# Altium integrated library Cap-Tant-SMD_V2.IntLib: 147 symbols
Pins are listed as number, name and electrical type; pins without a type are passive.

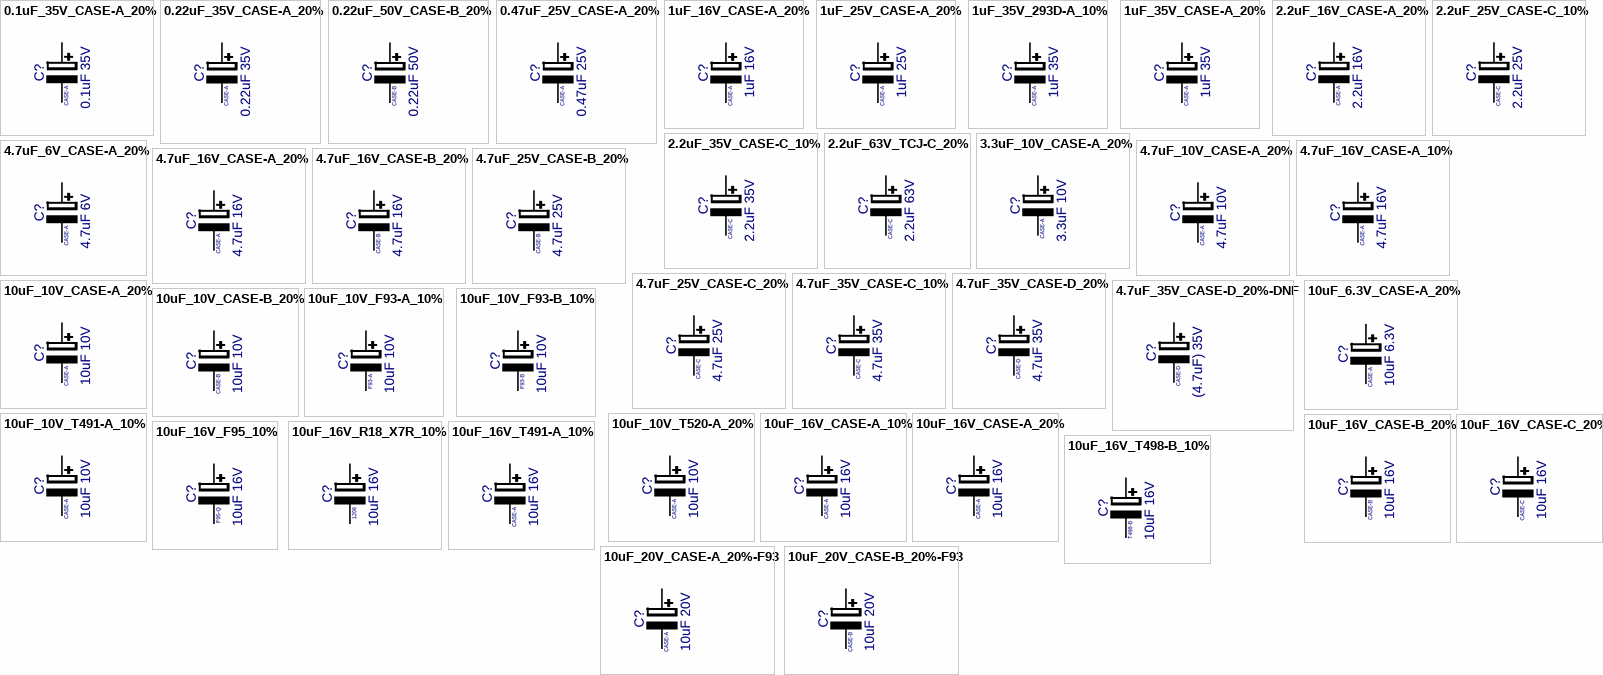
[diagram p0: symbols 0.1uF_35V_CASE-A_20% to 10uF_20V_CASE-B_20%-F93]

## 0.1uF_35V_CASE-A_20%
designator C?, comment value 0.1uF  Voltage: 35V  Text1: CASE-A  (hidden comment: 0.1uF_35V_T491A_20%)
Cap Tantalum Case-A; Manufacturer: Various; Tol: 20%; Reutech PN: 5910-TN-; Part Number: 0.1uF_35V_T491A_20%; Package: T491-A; EDM-PN: *; Text2: *; SAAB PN: *; DCE Part No: *
footprint T491-A (Tant Capacitor, 2-Leads, Body 3.2x1.6mm, IPC Medium Density)
pins: 1, 2

## 0.22uF_35V_CASE-A_20%
designator C?, comment value 0.22uF  Voltage: 35V  Text1: CASE-A  (hidden comment: 0.22uF_35V_T491A_20%)
Cap Tantalum Case-A; Manufacturer: Various; Tol: 20%; Reutech PN: 5910-TN-; Part Number: 0.22uF_35V_T491A_20%; Package: T491-A; EDM-PN: *; Text2: *; SAAB PN: *; DCE Part No: *
footprint T491-A (Tant Capacitor, 2-Leads, Body 3.2x1.6mm, IPC Medium Density)
pins: 1, 2

## 0.22uF_50V_CASE-B_20%
designator C?, comment value 0.22uF  Voltage: 50V  Text1: CASE-B  (hidden comment: 0.22uF_50V_T491B_20%)
Cap Tantalum Case-B; Manufacturer: Various; Part Number: 0.22uF_35V_T491B_20%; Tol: 20%; Reutech PN: 5910-TN-; Package: T491-B; EDM-PN: *; Text2: *; SAAB PN: *; DCE Part No: *
footprint T491-B (Tant Capacitor, 2-Leads, Body 3.5x2.8mm, IPC Medium Density)
pins: 1, 2

## 0.47uF_25V_CASE-A_20%
designator C?, comment value 0.47uF  Voltage: 25V  Text1: CASE-A  (hidden comment: 0.47uF_25V_T491A_20%)
Cap Tantalum Case-A; Manufacturer: Various; Tol: 20%; Reutech PN: 5910-TN-; Part Number: 0.47uF_25V_T491A_20%; Package: T491-A; EDM-PN: *; Text2: *; SAAB PN: *; DCE Part No: *
footprint T491-A (Tant Capacitor, 2-Leads, Body 3.2x1.6mm, IPC Medium Density)
pins: 1, 2

## 1uF_16V_CASE-A_20%
designator C?, comment value 1uF  Voltage: 16V  Text1: CASE-A  (hidden comment: 1uF_16V_T491A_20%)
Cap Tantalum Case-A; Manufacturer: Various; Tol: 20%; Reutech PN: 5910-TN-; Part Number: 1uF_16V_T491A_20%; Package: T491-A; EDM-PN: *; Text2: *; SAAB PN: *; DCE Part No: *
footprint T491-A (Tant Capacitor, 2-Leads, Body 3.2x1.6mm, IPC Medium Density)
pins: 1, 2

## 1uF_25V_CASE-A_20%
designator C?, comment value 1uF  Voltage: 25V  Text1: CASE-A  (hidden comment: 1uF_25V_T491A_20%)
Cap Tantalum Case-A; Manufacturer: Various; Tol: 20%; Reutech PN: 5910-TN-; Part Number: 1uF_25V_T491A_20%; Package: T491-A; EDM-PN: *; Text2: *; SAAB PN: *; DCE Part No: *
footprint T491-A (Tant Capacitor, 2-Leads, Body 3.2x1.6mm, IPC Medium Density)
pins: 1, 2

## 1uF_35V_293D-A_10%
designator C?  value 1uF  Voltage: 35V  Text1: CASE-A  (hidden comment: 1uF_35V_293D-A_10%)
Cap Tantalum Case-A - 293D; Manufacturer: Vishay; Part Number: 293D105X9035A2TE3; Tol: 10%; Reutech PN: 5910-TN-; Package: T491-A; EDM-PN: *; Text2: *; SAAB PN: *; DCE Part No: *
footprint T491-A (Tant Capacitor, 2-Leads, Body 3.2x1.6mm, IPC Medium Density)
pins: 1, 2

## 1uF_35V_CASE-A_20%
designator C?, comment value 1uF  Voltage: 35V  Text1: CASE-A  (hidden comment: 1uF_35V_T491A_20%)
Cap Tantalum Case-A; Manufacturer: Various; Tol: 20%; Reutech PN: 5910-TN-; Part Number: 1uF_35V_T491A_20%; Package: T491-A; EDM-PN: *; Text2: *; SAAB PN: *; DCE Part No: *
footprint T491-A (Tant Capacitor, 2-Leads, Body 3.2x1.6mm, IPC Medium Density)
pins: 1, 2

## 2.2uF_16V_CASE-A_20%
designator C?, comment value 2.2uF  Voltage: 16V  Text1: CASE-A  (hidden comment: 2.2uF_16V_T491A_20%)
Cap Tantalum Case-A; Manufacturer: Various; Tol: 20%; Reutech PN: 5910-TN-; Part Number: 2.2uF_16V_T491A_20%; Package: T491-A; EDM-PN: *; Text2: *; SAAB PN: *; DCE Part No: *
footprint T491-A (Tant Capacitor, 2-Leads, Body 3.2x1.6mm, IPC Medium Density)
pins: 1, 2

## 2.2uF_25V_CASE-C_10%
designator C?, comment value 2.2uF  Voltage: 25V  Text1: CASE-C  (hidden comment: 2.2uF_25V_T491C_10%)
Cap Tantalum Case-C; Manufacturer: Various; Tol: 10%; Reutech PN: 5910-TN-; Part Number: 2.2uF_25V_T491C_10%; Package: T491-C; EDM-PN: *; Text2: *; SAAB PN: *; DCE Part No: *
footprint T491-C (Tant Capacitor, 2-Leads, Body 6.0x3.2mm, IPC Medium Density)
pins: 1, 2

## 2.2uF_35V_CASE-C_10%
designator C?, comment value 2.2uF  Voltage: 35V  Text1: CASE-C  (hidden comment: 2.2uF_35V_T491C_10%)
Cap Tantalum Case-C; Manufacturer: Various; Tol: 10%; Reutech PN: 5910-TN-; Part Number: 2.2uF_35V_T491C_10%; Package: T491-C; EDM-PN: *; Text2: *; SAAB PN: *; DCE Part No: *
footprint T491-C (Tant Capacitor, 2-Leads, Body 6.0x3.2mm, IPC Medium Density)
pins: 1, 2

## 2.2uF_63V_TCJ-C_20%
designator C?, comment value 2.2uF  Voltage: 63V  Text1: CASE-C  (hidden comment: TCJC225M063R0200)
Cap Tantalum-Polymer Case-C; Manufacturer: AVX; Tol: 20%; Reutech PN: 5910-TN-; Part Number: TCJC225M063R0200; Package: T491-C; EDM-PN: *; Text2: *; SAAB PN: *; DCE Part No: *
footprint T491-C (Tant Capacitor, 2-Leads, Body 6.0x3.2mm, IPC Medium Density)
pins: 1, 2

## 3.3uF_10V_CASE-A_20%
designator C?, comment value 3.3uF  Voltage: 10V  Text1: CASE-A  (hidden comment: 3.3uF_10V_T491A_20%)
Cap Tantalum Case-A; Manufacturer: Various; Tol: 20%; Reutech PN: 5910-TN-; Part Number: 3.3uF_10V_T491A_20%; Package: T491-A; EDM-PN: *; Text2: *; SAAB PN: *; DCE Part No: *
footprint T491-A (Tant Capacitor, 2-Leads, Body 3.2x1.6mm, IPC Medium Density)
pins: 1, 2

## 4.7uF_6V_CASE-A_20%
designator C?, comment value 4.7uF  Voltage: 6V  Text1: CASE-A  (hidden comment: 4.7uF_6V_T491A_20%)
Cap Tantalum Case-A; Manufacturer: Various; Tol: 20%; Reutech PN: 5910-TN-; Part Number: 4.7uF_6V_T491A_20%; Package: T491-A; EDM-PN: *; Text2: *; SAAB PN: *; DCE Part No: *
footprint T491-A (Tant Capacitor, 2-Leads, Body 3.2x1.6mm, IPC Medium Density)
pins: 1, 2

## 4.7uF_10V_CASE-A_20%
designator C?, comment value 4.7uF  Voltage: 10V  Text1: CASE-A  (hidden comment: 4.7uF_10V_T491A_20%)
Cap Tantalum Case-A; Manufacturer: Various; Tol: 20%; Reutech PN: 5910-TN-; Part Number: 4.7uF_10V_T491A_20%; Package: T491-A; EDM-PN: *; Text2: *; SAAB PN: *; DCE Part No: *
footprint T491-A (Tant Capacitor, 2-Leads, Body 3.2x1.6mm, IPC Medium Density)
pins: 1, 2

## 4.7uF_16V_CASE-A_10%
designator C?, comment value 4.7uF  Voltage: 16V  Text1: CASE-A  (hidden comment: 4.7uF_16V_T491A_10%)
Cap Tantalum Case-A; Manufacturer: Various; EDM-PN: CAP36; Tol: 10%; Reutech PN: 5910-TN-; Part Number: 4.7uF_16V_T491A_10%; Package: T491-A; Text2: *; SAAB PN: *; DCE Part No: *
footprint T491-A (Tant Capacitor, 2-Leads, Body 3.2x1.6mm, IPC Medium Density)
pins: 1, 2

## 4.7uF_16V_CASE-A_20%
designator C?, comment value 4.7uF  Voltage: 16V  Text1: CASE-A  (hidden comment: 4.7uF_16V_T491A_20%)
Cap Tantalum Case-A; Manufacturer: Various; EDM-PN: CAP36; Tol: 20%; Reutech PN: 5910-TN-; Part Number: 4.7uF_16V_T491A_20%; Package: T491-A; Text2: *; SAAB PN: *; DCE Part No: *
footprint T491-A (Tant Capacitor, 2-Leads, Body 3.2x1.6mm, IPC Medium Density)
pins: 1, 2

## 4.7uF_16V_CASE-B_20%
designator C?, comment value 4.7uF  Voltage: 16V  Text1: CASE-B  (hidden comment: 4.7uF_16V_T491B_20%)
Cap Tantalum Case-B; Manufacturer: Various; Tol: 20%; Reutech PN: 5910-TN-; Part Number: 4.7uF_16V_T491B_20%; Package: T491-B; EDM-PN: *; Text2: *; SAAB PN: *; DCE Part No: *
footprint T491-B (Tant Capacitor, 2-Leads, Body 3.5x2.8mm, IPC Medium Density)
pins: 1, 2

## 4.7uF_25V_CASE-B_20%
designator C?, comment value 4.7uF  Voltage: 25V  Text1: CASE-B  (hidden comment: 4.7uF_25V_T491B_20%)
Cap Tantalum Case-B; Manufacturer: Various; Tol: 20%; Reutech PN: 5910-TN-; Part Number: 4.7uF_25V_T491B_20%; Package: T491-B; EDM-PN: *; Text2: *; SAAB PN: *; DCE Part No: *
footprint T491-B (Tant Capacitor, 2-Leads, Body 3.5x2.8mm, IPC Medium Density)
pins: 1, 2

## 4.7uF_25V_CASE-C_20%
designator C?, comment value 4.7uF  Voltage: 25V  Text1: CASE-C  (hidden comment: 4.7uF_25V_T491C_20%)
Cap Tantalum Case-C; Manufacturer: Various; Tol: 20%; Reutech PN: 5910-TN-; Part Number: 4.7uF_25V_T491C_20%; Package: T491-C; EDM-PN: *; Text2: *; SAAB PN: *; DCE Part No: *
footprint T491-C (Tant Capacitor, 2-Leads, Body 6.0x3.2mm, IPC Medium Density)
pins: 1, 2

## 4.7uF_35V_CASE-C_10%
designator C?, comment value 4.7uF  Voltage: 35V  Text1: CASE-C  (hidden comment: 4.7uF_35V_T491C_10%)
Cap Tantalum Case-C; Manufacturer: Various; EDM-PN: CAP37; Tol: 10%; Reutech PN: 5910-TN-; Part Number: 4.7uF_35V_T491C_10%; Package: T491-C; Text2: *; SAAB PN: *; DCE Part No: *
footprint T491-C (Tant Capacitor, 2-Leads, Body 6.0x3.2mm, IPC Medium Density)
pins: 1, 2

## 4.7uF_35V_CASE-D_20%
designator C?, comment value 4.7uF  Voltage: 35V  Text1: CASE-D  (hidden comment: 4.7uF_35V_T491D_20%)
Cap Tantalum Case-D; Manufacturer: Various; Tol: 20%; Reutech PN: 5910-TN-; Part Number: 4.7uF_35V_T491D_20%; Package: T491-D; EDM-PN: *; Text2: *; SAAB PN: *; DCE Part No: *
footprint T491-D (Tant Capacitor, 2-Leads, Body 7.3x4.3mm, IPC Medium Density)
pins: 1, 2

## 4.7uF_35V_CASE-D_20%-DNF
designator C?, comment value (4.7uF)  Voltage: 35V  Text1: CASE-D  (hidden comment: 4.7uF_35V_T491D_20%)
Cap Tantalum Case-D - Do not Fit; Manufacturer: Various; Part Number: DNF - 4.7uF_35V_T491D_20%; Tol: 20%; Reutech PN: 5910-TN-; Package: T491-D; EDM-PN: *; Text2: *; SAAB PN: *; DCE Part No: *
footprint T491-D (Tant Capacitor, 2-Leads, Body 7.3x4.3mm, IPC Medium Density)
pins: 1, 2

## 10uF_6.3V_CASE-A_20%
designator C?, comment value 10uF  Voltage: 6.3V  Text1: CASE-A  (hidden comment: 10uF_6.3V_T491A_20%)
Cap Tantalum Case-A; Manufacturer: Various; Tol: 20%; Reutech PN: 5910-TN-; Part Number: 10uF_6.3V_T491A_20%; Package: T491-A; EDM-PN: *; Text2: *; SAAB PN: *; DCE Part No: *
footprint T491-A (Tant Capacitor, 2-Leads, Body 3.2x1.6mm, IPC Medium Density)
pins: 1, 2

## 10uF_10V_CASE-A_20%
designator C?, comment value 10uF  Voltage: 10V  Text1: CASE-A  (hidden comment: 10uF_10V_T491A_20%)
Cap Tantalum Case-A; Manufacturer: Various; EDM-PN: CAP541; Tol: 20%; Reutech PN: 5910-TN-; Part Number: 10uF_10V_T491A_20%; Package: T491-A; Text2: *; SAAB PN: *; DCE Part No: *
footprint T491-A (Tant Capacitor, 2-Leads, Body 3.2x1.6mm, IPC Medium Density)
pins: 1, 2

## 10uF_10V_CASE-B_20%
designator C?, comment value 10uF  Voltage: 10V  Text1: CASE-B  (hidden comment: 10uF_10V_T491B_20%)
Cap Tantalum Case-B; Manufacturer: Various; Tol: 20%; Reutech PN: 5910-TN-; Part Number: 10uF_10V_T491B_20%; Package: T491-B; EDM-PN: *; Text2: *; SAAB PN: *; DCE Part No: *
footprint T491-B (Tant Capacitor, 2-Leads, Body 3.5x2.8mm, IPC Medium Density)
pins: 1, 2

## 10uF_10V_F93-A_10%
designator C?  value 10uF  Voltage: 10V  Text1: F93-A  (hidden comment: 10uF_10V_F93-A_10%)
Cap Tantalum Case-A; Manufacturer: AVX; Part Number: F931D106MAA; Tol: 10%; Reutech PN: 5910-TN-; Package: Tant-F93-A; EDM-PN: *; Text2: *; SAAB PN: *; DCE Part No: *
footprint Tant-F93-A (Tant Capacitor, 2-Leads, Body 3.2x1.6mm, IPC Medium Density)
pins: 1, 2

## 10uF_10V_F93-B_10%
designator C?  value 10uF  Voltage: 10V  Text1: F93-B  (hidden comment: 10uF_10V_F93-B_10%)
Cap Tantalum Case-B; Manufacturer: AVX; Part Number: F931D106MBA; Tol: 10%; Reutech PN: 5910-TN-; Package: Tant-F93-B; EDM-PN: *; Text2: *; SAAB PN: *; DCE Part No: *
footprint Tant-F93-B (Tant Capacitor, 2-Leads, Body 3.5x2.8mm, IPC Medium Density)
pins: 1, 2

## 10uF_10V_T491-A_10%
designator C?, comment value 10uF  Voltage: 10V  Text1: CASE-A  (hidden comment: T491A106K010AT)
Cap Tantalum Case-A; Manufacturer: Kemet; Tol: 10%; Reutech PN: 5910-TN-; Part Number: T491A106K010AT; Package: T491-A; EDM-PN: *; Text2: *; SAAB PN: *; DCE Part No: *
footprint T491-A (Tant Capacitor, 2-Leads, Body 3.2x1.6mm, IPC Medium Density)
pins: 1, 2

## 10uF_10V_T520-A_20%
designator C?, comment value 10uF  Voltage: 10V  Text1: CASE-A  (hidden comment: 10uF_10V_T520A_20%)
Cap Tantalum Case-A Low ESR; Manufacturer: Kemet; Part Number: T520A106M010ATE080; Tol: 20%; Reutech PN: 5910-TN-0186; Package: T491-A; EDM-PN: *; Text2: *; SAAB PN: *; DCE Part No: *
footprint T491-A (Tant Capacitor, 2-Leads, Body 3.2x1.6mm, IPC Medium Density)
pins: 1, 2

## 10uF_16V_CASE-A_10%
designator C?, comment value 10uF  Voltage: 16V  Text1: CASE-A  (hidden comment: 10uF_16V_T491A_10%)
Cap Tantalum Case-A; Manufacturer: Various; EDM-PN: CAP213; Tol: 10%; Reutech PN: 5910-TN-; SAAB PN: 1AAC00100AEA; Part Number: 10uF_16V_T491A_10%; Package: T491-A; Text2: *; DCE Part No: *
footprint T491-A (Tant Capacitor, 2-Leads, Body 3.2x1.6mm, IPC Medium Density)
pins: 1, 2

## 10uF_16V_CASE-A_20%
designator C?, comment value 10uF  Voltage: 16V  Text1: CASE-A  (hidden comment: 10uF_16V_T491A_20%)
Cap Tantalum Case-A; Manufacturer: Various; Tol: 20%; Reutech PN: 5910-TN-; Part Number: 10uF_16V_T491A_20%; Package: T491-A; EDM-PN: *; Text2: *; SAAB PN: *; DCE Part No: *
footprint T491-A (Tant Capacitor, 2-Leads, Body 3.2x1.6mm, IPC Medium Density)
pins: 1, 2

## 10uF_16V_CASE-B_20%
designator C?, comment value 10uF  Voltage: 16V  Text1: CASE-B  (hidden comment: 10uF_16V_T491B_20%)
Cap Tantalum Case-B; Manufacturer: Various; Tol: 20%; Reutech PN: 5910-TN-; Part Number: 10uF_16V_T491B_20%; Package: T491-B; EDM-PN: *; Text2: *; SAAB PN: *; DCE Part No: *
footprint T491-B (Tant Capacitor, 2-Leads, Body 3.5x2.8mm, IPC Medium Density)
pins: 1, 2

## 10uF_16V_CASE-C_20%
designator C?, comment value 10uF  Voltage: 16V  Text1: CASE-C  (hidden comment: 10uF_16V_T491C_20%)
Cap Tantalum Case-C; Manufacturer: Various; Tol: 20%; Reutech PN: 5910-TN-0085; Part Number: 10uF_16V_T491C_20%; Package: T491-C; EDM-PN: *; Text2: *; SAAB PN: *; DCE Part No: *
footprint T491-C (Tant Capacitor, 2-Leads, Body 6.0x3.2mm, IPC Medium Density)
pins: 1, 2

## 10uF_16V_F95_10%
designator C?, comment value 10uF  Voltage: 16V  Text1: F95-Q  (hidden comment: F951C106KQAAQ2)
Cap Tantalum Case F95-Q; Manufacturer: AVX; Tol: 10%; Reutech PN: 5910-TN-; Part Number: F951C106KQAAQ2; Package: F95-Q; EDM-PN: *; Text2: *; SAAB PN: *; DCE Part No: *
footprint F95-Q (F95-Q 3.2x1.6mm)
pins: 1, 2

## 10uF_16V_R18_X7R_10%
designator C?  value 10uF  Voltage: 16V  Text1: 1206  (hidden comment: 10uF_16V_R18_X7R_10%)
Cap TanCeram Chip; Manufacturer: Johansondielectrics; Part Number: 160R18X106KV4E; Tol: 10%; Reutech PN: 5910-TN-; Package: CAPC1206X178N; EDM-PN: *; Text2: *; SAAB PN: *; DCE Part No: *
footprint CAPC1206X178N (Chip Capacitor, 1206, 2-Leads, Body 3.2x1.6mm, IPC Medium Density)
pins: 1, 2

## 10uF_16V_T491-A_10%
designator C?, comment value 10uF  Voltage: 16V  Text1: CASE-A  (hidden comment: T491A106K010AT)
Cap Tantalum Case-A; Manufacturer: Kemet; EDM-PN: CAP213; Tol: 10%; Reutech PN: 5910-TN-; Part Number: T491A106K010AT; Package: T491-A; Text2: *; SAAB PN: *; DCE Part No: *
footprint T491-A (Tant Capacitor, 2-Leads, Body 3.2x1.6mm, IPC Medium Density)
pins: 1, 2

## 10uF_16V_T498-B_10%
designator C?, comment value 10uF  Voltage: 16V  Text1: T498-B  (hidden comment: 10uF_16V_T498B_10%)
Cap Tantalum Case-B (-55 +150Deg); Manufacturer: Kemet; Part Number: T498B106K016ATE2K8; Tol: 10%; Reutech PN: 5910-TN-; Package: T491-B; EDM-PN: *; Text2: *; SAAB PN: *; DCE Part No: *
footprint T491-B (Tant Capacitor, 2-Leads, Body 3.5x2.8mm, IPC Medium Density)
pins: 1, 2

## 10uF_20V_CASE-A_20%-F93
designator C?, comment value 10uF  Text1: CASE-A  Voltage: 20V  (hidden comment: 10uF_20V_T491A_20%-F93)
Cap Tantalum Case-A; Manufacturer: AVX; Part Number: F931D106KAA; Tol: 20%; Reutech PN: 5910-TN-; Package: T491-A; EDM-PN: *; Text2: *; SAAB PN: *; DCE Part No: *
footprint T491-A (Tant Capacitor, 2-Leads, Body 3.2x1.6mm, IPC Medium Density)
pins: 1, 2

## 10uF_20V_CASE-B_20%-F93
designator C?, comment value 10uF  Voltage: 20V  Text1: CASE-B  (hidden comment: 10uF_20V_T491B_20%)
Cap Tantalum Case-B; Manufacturer: Various; Part Number: F931D106KBA; Tol: 20%; Reutech PN: 5910-TN-; Package: T491-B; EDM-PN: *; Text2: *; SAAB PN: *; DCE Part No: *
footprint T491-B (Tant Capacitor, 2-Leads, Body 3.5x2.8mm, IPC Medium Density)
pins: 1, 2

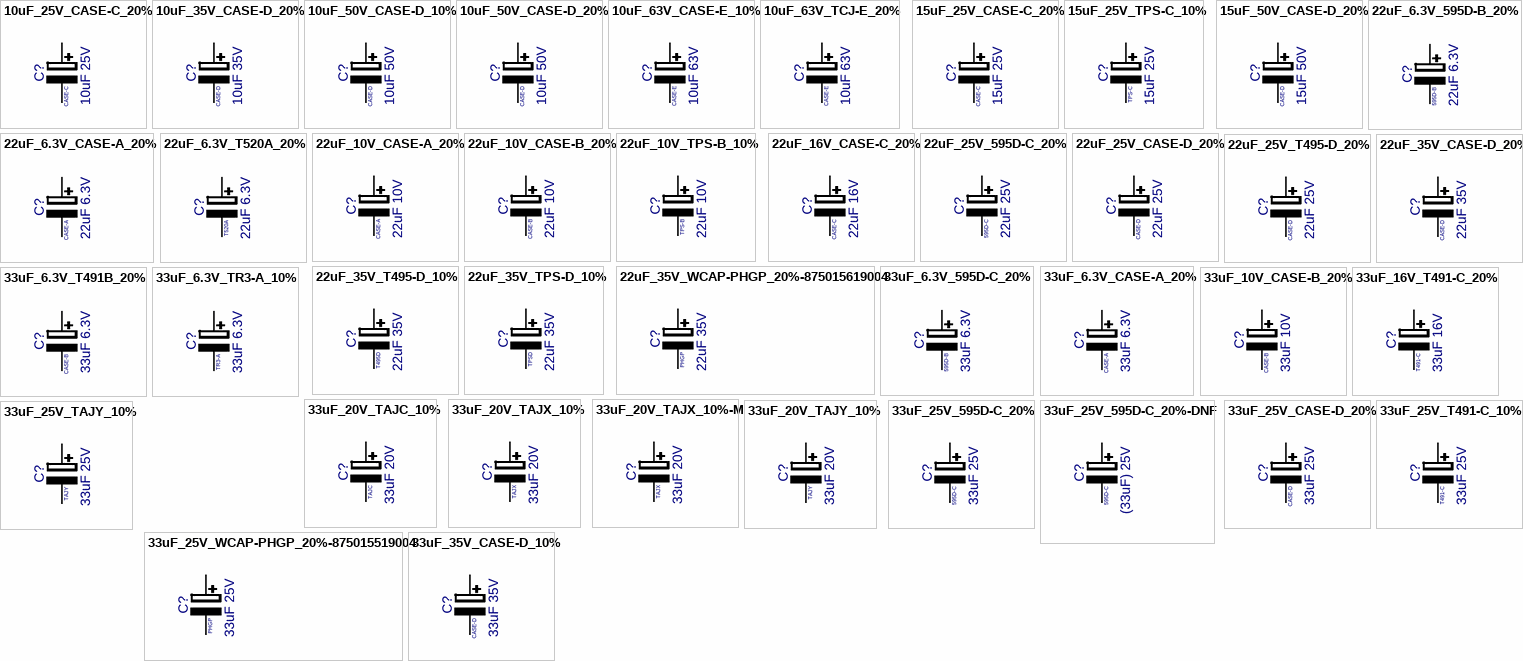
[diagram p1: symbols 10uF_25V_CASE-C_20% to 33uF_35V_CASE-D_10%]

## 10uF_25V_CASE-C_20%
designator C?, comment value 10uF  Voltage: 25V  Text1: CASE-C  (hidden comment: 10uF_25V_T491C_20%)
Cap Tantalum Case-C; Manufacturer: Various; Tol: 20%; Reutech PN: 5910-TN-; Part Number: 10uF_25V_T491C_20%; Package: T491-C; EDM-PN: *; Text2: *; SAAB PN: *; DCE Part No: *
footprint T491-C (Tant Capacitor, 2-Leads, Body 6.0x3.2mm, IPC Medium Density)
pins: 1, 2

## 10uF_35V_CASE-D_20%
designator C?, comment value 10uF  Voltage: 35V  Text1: CASE-D  (hidden comment: 10uF_35V_T491D_20%)
Cap Tantalum Case-D; Manufacturer: Various; Tol: 20%; Reutech PN: 5910-TN-; Part Number: 10uF_35V_T491D_20%; Package: T491-D; EDM-PN: *; Text2: *; SAAB PN: *; DCE Part No: *
footprint T491-D (Tant Capacitor, 2-Leads, Body 7.3x4.3mm, IPC Medium Density)
pins: 1, 2

## 10uF_50V_CASE-D_10%
designator C?, comment value 10uF  Voltage: 50V  Text1: CASE-D  (hidden comment: 10uF_50V_T491D_10%)
Cap Tantalum Case-D; Manufacturer: Various; Tol: 10%; Reutech PN: 5910-TN-; Part Number: 10uF_50V_T491D_10%; Package: T491-D; EDM-PN: *; Text2: *; SAAB PN: *; DCE Part No: *
footprint T491-D (Tant Capacitor, 2-Leads, Body 7.3x4.3mm, IPC Medium Density)
pins: 1, 2

## 10uF_50V_CASE-D_20%
designator C?, comment value 10uF  Voltage: 50V  Text1: CASE-D  (hidden comment: 10uF_50V_T491D_20%)
Cap Tantalum Case-D; Manufacturer: Various; Tol: 20%; Reutech PN: 5910-TN-; Part Number: 10uF_50V_T491D_20%; Package: T491-D; EDM-PN: *; Text2: *; SAAB PN: *; DCE Part No: *
footprint T491-D (Tant Capacitor, 2-Leads, Body 7.3x4.3mm, IPC Medium Density)
pins: 1, 2

## 10uF_63V_CASE-E_10%
designator C?, comment value 10uF  Voltage: 63V  Text1: CASE-E  (hidden comment: 293D106X9063E2TE3)
Cap Tantalum Type 293D Case-E; Manufacturer: Vishay; Tol: 10%; Reutech PN: 5910-TN-; Part Number: 293D106X9063E2TE3; Package: T491-E; EDM-PN: *; Text2: *; SAAB PN: *; DCE Part No: *
footprint T491-E (Tant Capacitor, 2-Leads, Body 7.3x6.0mm, IPC Medium Density)
pins: 1, 2

## 10uF_63V_TCJ-E_20%
designator C?, comment value 10uF  Voltage: 63V  Text1: CASE-E  (hidden comment: TCJE106M063R0100)
Cap Tantalum-Polymer Case-E; Manufacturer: AVX; Tol: 20%; Reutech PN: 5910-TN-; Part Number: TCJE106M063R0100; Package: T491-E; EDM-PN: *; Text2: *; SAAB PN: *; DCE Part No: *
footprint T491-E (Tant Capacitor, 2-Leads, Body 7.3x6.0mm, IPC Medium Density)
pins: 1, 2

## 15uF_25V_CASE-C_20%
designator C?, comment value 15uF  Voltage: 25V  Text1: CASE-C  (hidden comment: 15uF_25V_T491C_20%)
Cap Tantalum Case-C; Manufacturer: Various; Tol: 20%; Reutech PN: 5910-TN-; Part Number: 15uF_25V_T491C_20%; Package: T491-C; EDM-PN: *; Text2: *; SAAB PN: *; DCE Part No: *
footprint T491-C (Tant Capacitor, 2-Leads, Body 6.0x3.2mm, IPC Medium Density)
pins: 1, 2

## 15uF_25V_TPS-C_10%
designator C?  value 15uF  Voltage: 25V  Text1: TPS-C  (hidden comment: 15uF_25V_TPS-C_10%)
Cap Tantalum Case-C Low ESR; Manufacturer: AVX; Part Number: TPSC156K025R0220; EDM-PN: CAP1003; Tol: 10%; Reutech PN: 5910-TN-; SAAB PN: 1AAC00102AEA; Package: TPS-C; Text2: *; DCE Part No: *
footprint TPS-C (Tant Capacitor, 2-Leads, Body 6.0x3.2mm, IPC Medium Density)
pins: 1, 2

## 15uF_50V_CASE-D_20%
designator C?, comment value 15uF  Voltage: 50V  Text1: CASE-D  (hidden comment: 15uF_50V_Case-D_20%)
Cap Tantalum Case-D; Manufacturer: Various; Tol: 20%; Reutech PN: 5910-TN-; Part Number: 15uF_50V_Case-D_20%; Package: T491-D; EDM-PN: *; Text2: *; SAAB PN: *; DCE Part No: *
footprint T491-D (Tant Capacitor, 2-Leads, Body 7.3x4.3mm, IPC Medium Density)
pins: 1, 2

## 22uF_6.3V_595D-B_20%
designator C?  value 22uF  Voltage: 6.3V  Text1: 595D-B  (hidden comment: 22uF_6.3V_595D-B_20%)
Cap Tantalum Case-B; Manufacturer: Vishay; Part Number: 595D226X06R3B2T; Tol: 20%; Reutech PN: 5910-TN-; Package: T595D-B; EDM-PN: *; Text2: *; SAAB PN: *; DCE Part No: *
footprint T595D-B (Tant Capacitor, 2-Leads, Body 3.5x2.8mm, IPC Medium Density)
pins: 1, 2

## 22uF_6.3V_CASE-A_20%
designator C?, comment value 22uF  Voltage: 6.3V  Text1: CASE-A  (hidden comment: 22uF_6.3V_T491A_20%)
Cap Tantalum Case-A; Manufacturer: Various; Tol: 20%; Reutech PN: 5910-TN-; Part Number: 22uF_6.3V_T491A_20%; Package: T491-A; EDM-PN: *; Text2: *; SAAB PN: *; DCE Part No: *
footprint T491-A (Tant Capacitor, 2-Leads, Body 3.2x1.6mm, IPC Medium Density)
pins: 1, 2

## 22uF_6.3V_T520A_20%
designator C?  value 22uF  Voltage: 6.3V  Text1: T520A  (hidden comment: 22uF_6.3V_T520A_20%)
Cap Tantalum Case-A Low ESR; Manufacturer: Kemet; Part Number: T520A226M006ATE100; Tol: 20%; Reutech PN: 5910-TN-; Package: T491-A; EDM-PN: *; Text2: *; SAAB PN: *; DCE Part No: *
footprint T491-A (Tant Capacitor, 2-Leads, Body 3.2x1.6mm, IPC Medium Density)
pins: 1, 2

## 22uF_10V_CASE-A_20%
designator C?, comment value 22uF  Voltage: 10V  Text1: CASE-A  (hidden comment: 22uF_10V_T491A_20%)
Cap Tantalum Case-A; Manufacturer: Various; Tol: 20%; Reutech PN: 5910-TN-; Part Number: 22uF_10V_T491A_20%; Package: T491-A; EDM-PN: *; Text2: *; SAAB PN: *; DCE Part No: *
footprint T491-A (Tant Capacitor, 2-Leads, Body 3.2x1.6mm, IPC Medium Density)
pins: 1, 2

## 22uF_10V_CASE-B_20%
designator C?, comment value 22uF  Voltage: 10V  Text1: CASE-B  (hidden comment: 22uF_10V_T491B_20%)
Cap Tantalum Case-B; Manufacturer: Various; Tol: 20%; Reutech PN: 5910-TN-; Part Number: 22uF_10V_T491B_20%; Package: T491-C; EDM-PN: *; Text2: *; SAAB PN: *; DCE Part No: *
footprint T491-B (Tant Capacitor, 2-Leads, Body 3.5x2.8mm, IPC Medium Density)
pins: 1, 2

## 22uF_10V_TPS-B_10%
designator C?, comment value 22uF  Voltage: 10V  Text1: TPS-B  (hidden comment: 22uF_10V_TPS_B_10%)
Cap Tantalum Case-B Low ESR; Manufacturer: AVX; Part Number: TPSB226K010R0700; EDM-PN: CAP1004; Tol: 10%; Reutech PN: 5910-TN-; SAAB PN: 1AAC00108AEA; Package: TPS-B; Text2: *; DCE Part No: *
footprint T491-B (Tant Capacitor, 2-Leads, Body 3.5x2.8mm, IPC Medium Density)
pins: 1, 2

## 22uF_16V_CASE-C_20%
designator C?, comment value 22uF  Voltage: 16V  Text1: CASE-C  (hidden comment: 22uF_16V_T491C_20%)
Cap Tantalum Case-C; Manufacturer: Various; DCE Part No: 8441; Tol: 20%; Reutech PN: 5910-TN-; Part Number: 22uF_16V_T491C_20%; Package: T491-C; EDM-PN: *; Text2: *; SAAB PN: *
footprint T491-C (Tant Capacitor, 2-Leads, Body 6.0x3.2mm, IPC Medium Density)
pins: 1, 2

## 22uF_25V_595D-C_20%
designator C?  value 22uF  Voltage: 25V  Text1: 595D-C  (hidden comment: 22uF_25V_595D-C_20%)
Cap Tantalum Case-C; Manufacturer: Vishay; Part Number: 595D226X0025C2T; Tol: 20%; Reutech PN: 5910-TN-; Package: T595D-C; EDM-PN: *; Text2: *; SAAB PN: *; DCE Part No: *
footprint T595D-C (Tant Capacitor, 2-Leads, Body 6.0x3.2mm, IPC Medium Density)
pins: 1, 2

## 22uF_25V_CASE-D_20%
designator C?, comment value 22uF  Voltage: 25V  Text1: CASE-D  (hidden comment: 22uF_25V_T491D_20%)
Cap Tantalum Case-D; Manufacturer: Various; Tol: 20%; Reutech PN: 5910-TN-; Part Number: 22uF_25V_T491D_20%; Package: T491-D; EDM-PN: *; Text2: *; SAAB PN: *; DCE Part No: *
footprint T491-D (Tant Capacitor, 2-Leads, Body 7.3x4.3mm, IPC Medium Density)
pins: 1, 2

## 22uF_25V_T495-D_20%
designator C?  value 22uF  Voltage: 25V  Text1: CASE-D  (hidden comment: 22uF_25V_T495-D_20%)
Cap Tantalum T495 Low ESR; Manufacturer: Kemet; Part Number: T495D226M025ATE200; Tol: 20%; Reutech PN: 5910-TN-0194; Package: T491-D; EDM-PN: *; Text2: *; SAAB PN: *; DCE Part No: *
footprint T491-D (Tant Capacitor, 2-Leads, Body 7.3x4.3mm, IPC Medium Density)
pins: 1, 2

## 22uF_35V_CASE-D_20%
designator C?, comment value 22uF  Voltage: 35V  Text1: CASE-D  (hidden comment: 22uF_35V_T491D_20%)
Cap Tantalum Case-D; Manufacturer: Various; Tol: 20%; Reutech PN: 5910-TN-; Part Number: 22uF_35V_T491D_20%; Package: T491-D; EDM-PN: *; Text2: *; SAAB PN: *; DCE Part No: *
footprint T491-D (Tant Capacitor, 2-Leads, Body 7.3x4.3mm, IPC Medium Density)
pins: 1, 2

## 22uF_35V_T495-D_10%
designator C?, comment value 22uF  Voltage: 35V  Text1: T495D  (hidden comment: 22uF_35V_T495D_10%)
Cap Tantalum Case-D Low ESR; Manufacturer: Kemet; Part Number: T495D226K035ATE; Tol: 10%; Reutech PN: 5910-TN-; Package: TPS-D; EDM-PN: *; Text2: *; SAAB PN: *; DCE Part No: *
footprint T491-D (Tant Capacitor, 2-Leads, Body 7.3x4.3mm, IPC Medium Density)
pins: 1, 2

## 22uF_35V_TPS-D_10%
designator C?, comment value 22uF  Voltage: 35V  Text1: TPSD  (hidden comment: 22uF_35V_TPSD_10%)
Cap Tantalum Case-D Low ESR; Manufacturer: AVX; Part Number: TPSD226K035R0125; Tol: 10%; Reutech PN: 5910-TN-; Package: TPS-D; EDM-PN: *; Text2: *; SAAB PN: *; DCE Part No: *
footprint TPS-D (Tant Capacitor, 2-Leads, Body 7.3x4.3mm, IPC Medium Density)
pins: 1, 2

## 22uF_35V_WCAP-PHGP_20%-875015619004
designator C?, comment value 22uF  Voltage: 35V  Text1: PHGP  (hidden comment: 875015619004)
Cap Aluminum Polymer; Manufacturer: Wurth; Tol: 20%; Reutech PN: 5910-TN-; Part Number: 875015619004; Package: WCAP-PHGP-7.3x4.3-1.9; EDM-PN: *; Text2: *; SAAB PN: *; DCE Part No: *
footprint WCAP-PHGP-7.3x4.3-1.9 (Aluminum Polymer 7.3x4.3mm)
pins: 1, 2

## 33uF_6.3V_595D-C_20%
designator C?  value 33uF  Voltage: 6.3V  Text1: 595D-B  (hidden comment: 33uF_6.3V_595D-C_20%)
Cap Tantalum Case-C; Manufacturer: Vishay; Part Number: 595D336X06R3B2T; Tol: 20%; Reutech PN: 5910-TN-; Package: T595D-B; EDM-PN: *; Text2: *; SAAB PN: *; DCE Part No: *
footprint T595D-C (Tant Capacitor, 2-Leads, Body 6.0x3.2mm, IPC Medium Density)
pins: 1, 2

## 33uF_6.3V_CASE-A_20%
designator C?, comment value 33uF  Voltage: 6.3V  Text1: CASE-A  (hidden comment: 33uF_6.3V_T491A_20%)
Cap Tantalum Case-A; Manufacturer: Various; Tol: 20%; Reutech PN: 5910-TN-; Part Number: 33uF_6.3V_T491A_20%; Package: T491-A; EDM-PN: *; Text2: *; SAAB PN: *; DCE Part No: *
footprint T491-A (Tant Capacitor, 2-Leads, Body 3.2x1.6mm, IPC Medium Density)
pins: 1, 2

## 33uF_6.3V_T491B_20%
designator C?  value 33uF  Voltage: 6.3V  Text1: CASE-B  (hidden comment: 33uF_6.3V_T491B_20%)
Cap Tantalum Case-B; Manufacturer: Kemet; Part Number: T491B336M006AT; Tol: 20%; Reutech PN: 5910-TN-0193; Package: T491-B; EDM-PN: *; Text2: *; SAAB PN: *; DCE Part No: *
footprint T491-B (Tant Capacitor, 2-Leads, Body 3.5x2.8mm, IPC Medium Density)
pins: 1, 2

## 33uF_6.3V_TR3-A_10%
designator C?  value 33uF  Voltage: 6.3V  Text1: TR3-A  (hidden comment: 33uF_6.3V_TR3-A_10%)
Cap Tantalum Case-A Low ESR; Manufacturer: Vishay; Part Number: TR3A336K6R3C0600; Tol: 10%; Reutech PN: 5910-TN-; Package: TR3-A; EDM-PN: *; Text2: *; SAAB PN: *; DCE Part No: *
footprint TR3-A (TR3 2-Leads, Body 3.2x1.6mm)
pins: 1, 2

## 33uF_10V_CASE-B_20%
designator C?, comment value 33uF  Voltage: 10V  Text1: CASE-B  (hidden comment: 33uF_10V_T491B_20%)
Cap Tantalum Case-B; Manufacturer: Various; Tol: 20%; Reutech PN: 5910-TN-; Part Number: 33uF_10V_T491B_20%; Package: T491-B; EDM-PN: *; Text2: *; SAAB PN: *; DCE Part No: *
footprint T491-B (Tant Capacitor, 2-Leads, Body 3.5x2.8mm, IPC Medium Density)
pins: 1, 2

## 33uF_16V_T491-C_20%
designator C?  value 33uF  Voltage: 16V  Text1: T491-C  (hidden comment: 33uF_16V_T491-C_20%)
Cap Tantalum Case-C; Manufacturer: Kemet; Part Number: T491C336M016AT; Tol: 20%; Reutech PN: 5910-TN-; Package: T491-C; EDM-PN: *; Text2: *; SAAB PN: *; DCE Part No: *
footprint T491-C (Tant Capacitor, 2-Leads, Body 6.0x3.2mm, IPC Medium Density)
pins: 1, 2

## 33uF_20V_TAJC_10%
designator C?  value 33uF  Voltage: 20V  Text1: TAJC  (hidden comment: 33uF_20V_TAJC_10%)
Cap Tantalum Case-C; Manufacturer: AVX; Part Number: TAJC336K020RNJ; Tol: 10%; Reutech PN: 5910-TN-; Package: T491-C; EDM-PN: *; Text2: *; SAAB PN: *; DCE Part No: *
footprint T491-C (Tant Capacitor, 2-Leads, Body 6.0x3.2mm, IPC Medium Density)
pins: 1, 2

## 33uF_20V_TAJX_10%
designator C?  value 33uF  Voltage: 20V  Text1: TAJX  (hidden comment: 33uF_20V_TAJX_10%)
Cap Tantalum Case-X; Manufacturer: AVX; Part Number: TAJX336K020RNJ; Tol: 10%; Reutech PN: 5910-TN-; Package: TAJ-X; EDM-PN: *; Text2: *; SAAB PN: *; DCE Part No: *
footprint TAJ-X (Tant Capacitor, 2-Leads, Body 7.3x4.3mm, IPC Medium Density)
pins: 1, 2

## 33uF_20V_TAJX_10%-M
designator C?, comment value 33uF  Voltage: 20V  Text1: TAJX  (hidden comment: 33uF_20V_TAJX_10%)
Cap Tantalum Case-X; Manufacturer: AVX; Part Number: TAJX336K020RNJ; Tol: 10%; Reutech PN: 5910-TN-; Package: TAJ-X-MOST; EDM-PN: *; Text2: *; SAAB PN: *; DCE Part No: *
footprint TAJ-X-MOST (Tant Capacitor, 2-Leads, Body 7.3x4.3mm, IPC Medium Density)
pins: 1, 2
